# Altium footprint library ADP_SMT.PcbLib: 204 footprints (part 1 of 15)
Each footprint in its own frame and in the unit in brackets; x right, y up, seen from the top. Pads: shape width x height; smd on the part's side, far side on the other; paste and mask are expansions set on the pad; w line width, h text height; cw(c..) or ccw(c..) is an arc to the next point about the centre after c.
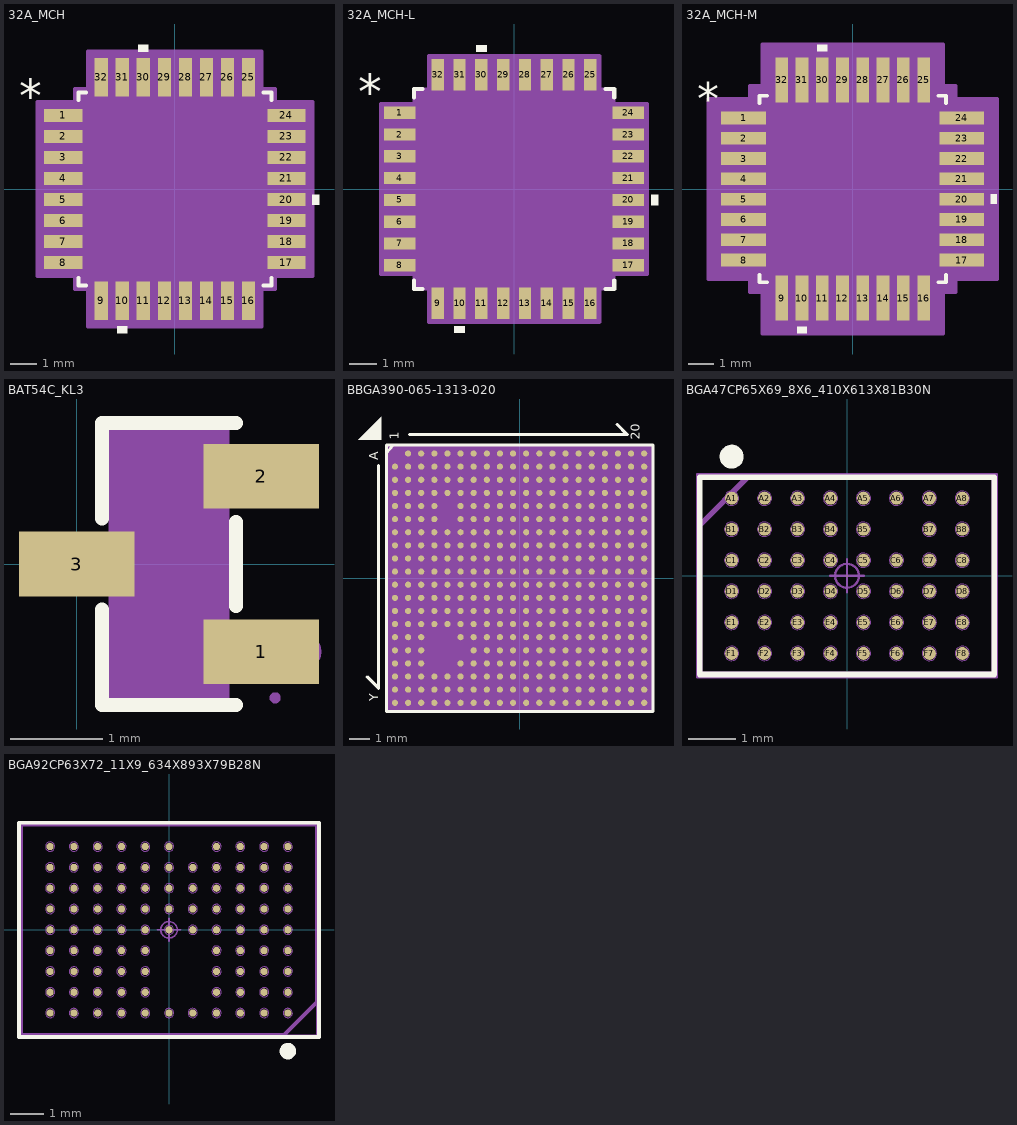
[diagram p0: the footprints below, top view; thin cyan lines are the x and y axes]

## 32A_MCH [mm]
pads (32):
  rect 1.461x0.501 smd paste+0 mask+0: 1(-4.25,2.8) 2(-4.25,2) 3(-4.25,1.2) 4(-4.25,0.4) 5(-4.25,-0.4) 6(-4.25,-1.2) 7(-4.25,-2) 8(-4.25,-2.8) 17(4.25,-2.8) 18(4.25,-2) 19(4.25,-1.2) 20(4.25,-0.4) 21(4.25,0.4) 22(4.25,1.2) 23(4.25,2) 24(4.25,2.8)
  rect 0.501x1.461 smd paste+0 mask+0: 9(-2.8,-4.25) 10(-2,-4.25) 11(-1.2,-4.25) 12(-0.4,-4.25) 13(0.4,-4.25) 14(1.2,-4.25) 15(2,-4.25) 16(2.8,-4.25) 25(2.8,4.25) 26(2,4.25) 27(1.2,4.25) 28(0.4,4.25) 29(-0.4,4.25) 30(-1.2,4.25) 31(-2,4.25) 32(-2.8,4.25)
Top Overlay:
  region: -1.01,5.235 -1.391,5.235 -1.391,5.489 -1.01,5.489
  region: 5.235,-0.209 5.489,-0.209 5.489,-0.59 5.235,-0.59
  region: -1.81,-5.235 -2.191,-5.235 -2.191,-5.489 -1.81,-5.489
  lines w0.152: -3.677,-3.383 -3.677,-3.677 -3.383,-3.677 ; -3.677,3.383 -3.677,3.677 -3.383,3.677 ; 3.383,-3.677 3.677,-3.677 3.677,-3.383 ; 3.383,3.677 3.677,3.677 3.677,3.383
  text "*" at -5.933,2.946 h1.27
Mechanical 13:
  lines w0.025: -3.55,2.28 -2.28,3.55 ; -4.625,-3.025 -3.55,-3.025 -3.55,-2.575 -4.625,-2.575 -4.625,-3.025 ; -4.625,-2.225 -3.55,-2.225 -3.55,-1.775 -4.625,-1.775 -4.625,-2.225 ; -4.625,-1.425 -3.55,-1.425 -3.55,-0.975 -4.625,-0.975 -4.625,-1.425 ; -4.625,-0.625 -3.55,-0.625 -3.55,-0.175 -4.625,-0.175 -4.625,-0.625 ; -4.625,0.175 -3.55,0.175 -3.55,0.625 -4.625,0.625 -4.625,0.175 ; -4.625,0.975 -3.55,0.975 -3.55,1.425 -4.625,1.425 -4.625,0.975 ; -4.625,1.775 -3.55,1.775 -3.55,2.225 -4.625,2.225 -4.625,1.775 ; -4.625,2.575 -3.55,2.575 -3.55,3.025 -4.625,3.025 -4.625,2.575 ; -3.55,-3.55 -3.55,3.55 3.55,3.55 3.55,-3.55 -3.55,-3.55 ; -3.025,-4.625 -2.575,-4.625 -2.575,-3.55 -3.025,-3.55 -3.025,-4.625 ; -3.025,3.55 -3.025,4.625 -2.575,4.625 -2.575,3.55 -3.025,3.55 ; -2.225,-4.625 -1.775,-4.625 -1.775,-3.55 -2.225,-3.55 -2.225,-4.625 ; -2.225,3.55 -2.225,4.625 -1.775,4.625 -1.775,3.55 -2.225,3.55 ; -1.425,-4.625 -0.975,-4.625 -0.975,-3.55 -1.425,-3.55 -1.425,-4.625 ; -1.425,3.55 -1.425,4.625 -0.975,4.625 -0.975,3.55 -1.425,3.55 ; -0.625,-4.625 -0.175,-4.625 -0.175,-3.55 -0.625,-3.55 -0.625,-4.625 ; -0.625,3.55 -0.625,4.625 -0.175,4.625 -0.175,3.55 -0.625,3.55 ; 0.175,-4.625 0.625,-4.625 0.625,-3.55 0.175,-3.55 0.175,-4.625 ; 0.175,3.55 0.175,4.625 0.625,4.625 0.625,3.55 0.175,3.55 ; 0.975,-4.625 1.425,-4.625 1.425,-3.55 0.975,-3.55 0.975,-4.625 ; 0.975,3.55 0.975,4.625 1.425,4.625 1.425,3.55 0.975,3.55 ; 1.775,-4.625 2.225,-4.625 2.225,-3.55 1.775,-3.55 1.775,-4.625 ; 1.775,3.55 1.775,4.625 2.225,4.625 2.225,3.55 1.775,3.55 ; 2.575,-4.625 3.025,-4.625 3.025,-3.55 2.575,-3.55 2.575,-4.625 ; 2.575,3.55 2.575,4.625 3.025,4.625 3.025,3.55 2.575,3.55 ; 3.55,-3.025 4.625,-3.025 4.625,-2.575 3.55,-2.575 3.55,-3.025 ; 3.55,-2.225 4.625,-2.225 4.625,-1.775 3.55,-1.775 3.55,-2.225 ; 3.55,-1.425 4.625,-1.425 4.625,-0.975 3.55,-0.975 3.55,-1.425 ; 3.55,-0.625 4.625,-0.625 4.625,-0.175 3.55,-0.175 3.55,-0.625 ; 3.55,0.175 4.625,0.175 4.625,0.625 3.55,0.625 3.55,0.175 ; 3.55,0.975 4.625,0.975 4.625,1.425 3.55,1.425 3.55,0.975 ; 3.55,1.775 4.625,1.775 4.625,2.225 3.55,2.225 3.55,1.775 ; 3.55,2.575 4.625,2.575 4.625,3.025 3.55,3.025 3.55,2.575
  text "*" at -3.487,2.565 h1.27
Mechanical 15:
  region: -3.304,-3.804 -3.804,-3.804 -3.804,-3.304 -5.235,-3.304 -5.235,3.304 -3.804,3.304 -3.804,3.804 -3.304,3.804 -3.304,5.235 3.304,5.235 3.304,3.804 3.804,3.804 3.804,3.304 5.235,3.304 5.235,-3.304 3.804,-3.304 3.804,-3.804 3.304,-3.804 3.304,-5.235 -3.304,-5.235
  lines w0.152: -5.235,-3.304 -5.235,3.304 -3.804,3.304 -3.804,3.804 -3.304,3.804 -3.304,5.235 3.304,5.235 3.304,3.804 3.804,3.804 3.804,3.304 5.235,3.304 5.235,-3.304 3.804,-3.304 3.804,-3.804 3.304,-3.804 3.304,-5.235 -3.304,-5.235 -3.304,-3.804 -3.804,-3.804 -3.804,-3.304 -5.235,-3.304
3D body "32A_MCH.step": height 1.2, standoff 0, extent -4.625,-4.625 4.625,4.625

## 32A_MCH-L [mm]
pads (32):
  rect 1.156x0.45 smd paste+0 mask+0: 1(-4.199,2.8) 2(-4.199,2) 3(-4.199,1.2) 4(-4.199,0.4) 5(-4.199,-0.4) 6(-4.199,-1.2) 7(-4.199,-2) 8(-4.199,-2.8) 17(4.199,-2.8) 18(4.199,-2) 19(4.199,-1.2) 20(4.199,-0.4) 21(4.199,0.4) 22(4.199,1.2) 23(4.199,2) 24(4.199,2.8)
  rect 0.45x1.156 smd paste+0 mask+0: 9(-2.8,-4.199) 10(-2,-4.199) 11(-1.2,-4.199) 12(-0.4,-4.199) 13(0.4,-4.199) 14(1.2,-4.199) 15(2,-4.199) 16(2.8,-4.199) 25(2.8,4.199) 26(2,4.199) 27(1.2,4.199) 28(0.4,4.199) 29(-0.4,4.199) 30(-1.2,4.199) 31(-2,4.199) 32(-2.8,4.199)
Top Overlay:
  region: -1.01,5.031 -1.391,5.031 -1.391,5.285 -1.01,5.285
  region: 5.031,-0.209 5.285,-0.209 5.285,-0.59 5.031,-0.59
  region: -1.81,-5.031 -2.191,-5.031 -2.191,-5.285 -1.81,-5.285
  lines w0.152: -3.677,-3.358 -3.677,-3.677 -3.358,-3.677 ; -3.677,3.358 -3.677,3.677 -3.358,3.677 ; 3.358,-3.677 3.677,-3.677 3.677,-3.358 ; 3.358,3.677 3.677,3.677 3.677,3.358
  text "*" at -5.73,2.946 h1.27
Mechanical 13:
  lines w0.025: -3.55,2.28 -2.28,3.55 ; -4.625,-3.025 -3.55,-3.025 -3.55,-2.575 -4.625,-2.575 -4.625,-3.025 ; -4.625,-2.225 -3.55,-2.225 -3.55,-1.775 -4.625,-1.775 -4.625,-2.225 ; -4.625,-1.425 -3.55,-1.425 -3.55,-0.975 -4.625,-0.975 -4.625,-1.425 ; -4.625,-0.625 -3.55,-0.625 -3.55,-0.175 -4.625,-0.175 -4.625,-0.625 ; -4.625,0.175 -3.55,0.175 -3.55,0.625 -4.625,0.625 -4.625,0.175 ; -4.625,0.975 -3.55,0.975 -3.55,1.425 -4.625,1.425 -4.625,0.975 ; -4.625,1.775 -3.55,1.775 -3.55,2.225 -4.625,2.225 -4.625,1.775 ; -4.625,2.575 -3.55,2.575 -3.55,3.025 -4.625,3.025 -4.625,2.575 ; -3.55,-3.55 3.55,-3.55 3.55,3.55 -3.55,3.55 -3.55,-3.55 ; -3.025,-4.625 -2.575,-4.625 -2.575,-3.55 -3.025,-3.55 -3.025,-4.625 ; -3.025,3.55 -3.025,4.625 -2.575,4.625 -2.575,3.55 -3.025,3.55 ; -2.225,-4.625 -1.775,-4.625 -1.775,-3.55 -2.225,-3.55 -2.225,-4.625 ; -2.225,3.55 -2.225,4.625 -1.775,4.625 -1.775,3.55 -2.225,3.55 ; -1.425,-4.625 -0.975,-4.625 -0.975,-3.55 -1.425,-3.55 -1.425,-4.625 ; -1.425,3.55 -1.425,4.625 -0.975,4.625 -0.975,3.55 -1.425,3.55 ; -0.625,-4.625 -0.175,-4.625 -0.175,-3.55 -0.625,-3.55 -0.625,-4.625 ; -0.625,3.55 -0.625,4.625 -0.175,4.625 -0.175,3.55 -0.625,3.55 ; 0.175,-4.625 0.625,-4.625 0.625,-3.55 0.175,-3.55 0.175,-4.625 ; 0.175,3.55 0.175,4.625 0.625,4.625 0.625,3.55 0.175,3.55 ; 0.975,-4.625 1.425,-4.625 1.425,-3.55 0.975,-3.55 0.975,-4.625 ; 0.975,3.55 0.975,4.625 1.425,4.625 1.425,3.55 0.975,3.55 ; 1.775,-4.625 2.225,-4.625 2.225,-3.55 1.775,-3.55 1.775,-4.625 ; 1.775,3.55 1.775,4.625 2.225,4.625 2.225,3.55 1.775,3.55 ; 2.575,-4.625 3.025,-4.625 3.025,-3.55 2.575,-3.55 2.575,-4.625 ; 2.575,3.55 2.575,4.625 3.025,4.625 3.025,3.55 2.575,3.55 ; 3.55,-3.025 4.625,-3.025 4.625,-2.575 3.55,-2.575 3.55,-3.025 ; 3.55,-2.225 4.625,-2.225 4.625,-1.775 3.55,-1.775 3.55,-2.225 ; 3.55,-1.425 4.625,-1.425 4.625,-0.975 3.55,-0.975 3.55,-1.425 ; 3.55,-0.625 4.625,-0.625 4.625,-0.175 3.55,-0.175 3.55,-0.625 ; 3.55,0.175 4.625,0.175 4.625,0.625 3.55,0.625 3.55,0.175 ; 3.55,0.975 4.625,0.975 4.625,1.425 3.55,1.425 3.55,0.975 ; 3.55,1.775 4.625,1.775 4.625,2.225 3.55,2.225 3.55,1.775 ; 3.55,2.575 4.625,2.575 4.625,3.025 3.55,3.025 3.55,2.575
  text "*" at -3.487,2.565 h1.27
Mechanical 15:
  region: -3.127,-3.652 -3.652,-3.652 -3.652,-3.127 -4.879,-3.127 -4.879,3.127 -3.652,3.127 -3.652,3.652 -3.127,3.652 -3.127,4.879 3.127,4.879 3.127,3.652 3.652,3.652 3.652,3.127 4.879,3.127 4.879,-3.127 3.652,-3.127 3.652,-3.652 3.127,-3.652 3.127,-4.879 -3.127,-4.879
  lines w0.152: -4.879,-3.127 -4.879,3.127 -3.652,3.127 -3.652,3.652 -3.127,3.652 -3.127,4.879 3.127,4.879 3.127,3.652 3.652,3.652 3.652,3.127 4.879,3.127 4.879,-3.127 3.652,-3.127 3.652,-3.652 3.127,-3.652 3.127,-4.879 -3.127,-4.879 -3.127,-3.652 -3.652,-3.652 -3.652,-3.127 -4.879,-3.127
3D body "32A_MCH.step": height 1.2, standoff 0, extent -4.625,-4.625 4.625,4.625

## 32A_MCH-M [mm]
pads (32):
  rect 1.766x0.501 smd paste+0 mask+0: 1(-4.301,2.8) 2(-4.301,2) 3(-4.301,1.2) 4(-4.301,0.4) 5(-4.301,-0.4) 6(-4.301,-1.2) 7(-4.301,-2) 8(-4.301,-2.8) 17(4.301,-2.8) 18(4.301,-2) 19(4.301,-1.2) 20(4.301,-0.4) 21(4.301,0.4) 22(4.301,1.2) 23(4.301,2) 24(4.301,2.8)
  rect 0.501x1.766 smd paste+0 mask+0: 9(-2.8,-4.301) 10(-2,-4.301) 11(-1.2,-4.301) 12(-0.4,-4.301) 13(0.4,-4.301) 14(1.2,-4.301) 15(2,-4.301) 16(2.8,-4.301) 25(2.8,4.301) 26(2,4.301) 27(1.2,4.301) 28(0.4,4.301) 29(-0.4,4.301) 30(-1.2,4.301) 31(-2,4.301) 32(-2.8,4.301)
Top Overlay:
  region: -1.01,5.438 -1.391,5.438 -1.391,5.692 -1.01,5.692
  region: 5.438,-0.209 5.692,-0.209 5.692,-0.59 5.438,-0.59
  region: -1.81,-5.438 -2.191,-5.438 -2.191,-5.692 -1.81,-5.692
  lines w0.152: -3.677,-3.383 -3.677,-3.677 -3.383,-3.677 ; -3.677,3.383 -3.677,3.677 -3.383,3.677 ; 3.383,-3.677 3.677,-3.677 3.677,-3.383 ; 3.383,3.677 3.677,3.677 3.677,3.383
  text "*" at -6.136,2.946 h1.27
Mechanical 13:
  lines w0.025: -3.55,2.28 -2.28,3.55 ; -4.625,-3.025 -3.55,-3.025 -3.55,-2.575 -4.625,-2.575 -4.625,-3.025 ; -4.625,-2.225 -3.55,-2.225 -3.55,-1.775 -4.625,-1.775 -4.625,-2.225 ; -4.625,-1.425 -3.55,-1.425 -3.55,-0.975 -4.625,-0.975 -4.625,-1.425 ; -4.625,-0.625 -3.55,-0.625 -3.55,-0.175 -4.625,-0.175 -4.625,-0.625 ; -4.625,0.175 -3.55,0.175 -3.55,0.625 -4.625,0.625 -4.625,0.175 ; -4.625,0.975 -3.55,0.975 -3.55,1.425 -4.625,1.425 -4.625,0.975 ; -4.625,1.775 -3.55,1.775 -3.55,2.225 -4.625,2.225 -4.625,1.775 ; -4.625,2.575 -3.55,2.575 -3.55,3.025 -4.625,3.025 -4.625,2.575 ; -3.55,-3.55 3.55,-3.55 3.55,3.55 -3.55,3.55 -3.55,-3.55 ; -3.025,-4.625 -2.575,-4.625 -2.575,-3.55 -3.025,-3.55 -3.025,-4.625 ; -3.025,3.55 -3.025,4.625 -2.575,4.625 -2.575,3.55 -3.025,3.55 ; -2.225,-4.625 -1.775,-4.625 -1.775,-3.55 -2.225,-3.55 -2.225,-4.625 ; -2.225,3.55 -2.225,4.625 -1.775,4.625 -1.775,3.55 -2.225,3.55 ; -1.425,-4.625 -0.975,-4.625 -0.975,-3.55 -1.425,-3.55 -1.425,-4.625 ; -1.425,3.55 -1.425,4.625 -0.975,4.625 -0.975,3.55 -1.425,3.55 ; -0.625,-4.625 -0.175,-4.625 -0.175,-3.55 -0.625,-3.55 -0.625,-4.625 ; -0.625,3.55 -0.625,4.625 -0.175,4.625 -0.175,3.55 -0.625,3.55 ; 0.175,-4.625 0.625,-4.625 0.625,-3.55 0.175,-3.55 0.175,-4.625 ; 0.175,3.55 0.175,4.625 0.625,4.625 0.625,3.55 0.175,3.55 ; 0.975,-4.625 1.425,-4.625 1.425,-3.55 0.975,-3.55 0.975,-4.625 ; 0.975,3.55 0.975,4.625 1.425,4.625 1.425,3.55 0.975,3.55 ; 1.775,-4.625 2.225,-4.625 2.225,-3.55 1.775,-3.55 1.775,-4.625 ; 1.775,3.55 1.775,4.625 2.225,4.625 2.225,3.55 1.775,3.55 ; 2.575,-4.625 3.025,-4.625 3.025,-3.55 2.575,-3.55 2.575,-4.625 ; 2.575,3.55 2.575,4.625 3.025,4.625 3.025,3.55 2.575,3.55 ; 3.55,-3.025 4.625,-3.025 4.625,-2.575 3.55,-2.575 3.55,-3.025 ; 3.55,-2.225 4.625,-2.225 4.625,-1.775 3.55,-1.775 3.55,-2.225 ; 3.55,-1.425 4.625,-1.425 4.625,-0.975 3.55,-0.975 3.55,-1.425 ; 3.55,-0.625 4.625,-0.625 4.625,-0.175 3.55,-0.175 3.55,-0.625 ; 3.55,0.175 4.625,0.175 4.625,0.625 3.55,0.625 3.55,0.175 ; 3.55,0.975 4.625,0.975 4.625,1.425 3.55,1.425 3.55,0.975 ; 3.55,1.775 4.625,1.775 4.625,2.225 3.55,2.225 3.55,1.775 ; 3.55,2.575 4.625,2.575 4.625,3.025 3.55,3.025 3.55,2.575
  text "*" at -3.487,2.565 h1.27
Mechanical 15:
  region: -3.558,-4.058 -4.058,-4.058 -4.058,-3.558 -5.692,-3.558 -5.692,3.558 -4.058,3.558 -4.058,4.058 -3.558,4.058 -3.558,5.692 3.558,5.692 3.558,4.058 4.058,4.058 4.058,3.558 5.692,3.558 5.692,-3.558 4.058,-3.558 4.058,-4.058 3.558,-4.058 3.558,-5.692 -3.558,-5.692
  lines w0.152: -5.692,-3.558 -5.692,3.558 -4.058,3.558 -4.058,4.058 -3.558,4.058 -3.558,5.692 3.558,5.692 3.558,4.058 4.058,4.058 4.058,3.558 5.692,3.558 5.692,-3.558 4.058,-3.558 4.058,-4.058 3.558,-4.058 3.558,-5.692 -3.558,-5.692 -3.558,-4.058 -4.058,-4.058 -4.058,-3.558 -5.692,-3.558
3D body "32A_MCH.step": height 1.2, standoff 0, extent -4.625,-4.625 4.625,4.625

## BAT54C_KL3 [mm]
pads (3):
  rect 1.25x0.7 smd: 1(2,-0.95) 2(2,0.95) 3(0,0)
Top Overlay:
  lines w0.152: 0.274,-0.495 0.274,-1.526 1.726,-1.526 ; 0.274,0.495 0.274,1.526 1.726,1.526 ; 1.726,-0.455 1.726,0.455
Mechanical 4:
  region: 0.35,-1.45 0.35,1.45 1.65,1.45 1.65,-1.45
Mechanical 5:
  region: 1.85,-1.165 1.85,-0.735 2.15,-0.735 2.15,-1.165
  pour cut-out: 1.64,-1.165 1.64,-0.735 1.86,-0.735 1.86,-1.165
  region: 1.85,0.735 1.85,1.165 2.15,1.165 2.15,0.735
  pour cut-out: 1.64,0.735 1.64,1.165 1.86,1.165 1.86,0.735
  region: 0.15,-0.215 0.15,0.215 -0.15,0.215 -0.15,-0.215
  pour cut-out: 0.14,-0.215 0.14,0.215 0.36,0.215 0.36,-0.215
Mechanical 6:
  circle w0.06: c2.15,-1.45 r0.03
Mechanical 15:
  circle w0.2: c2.45,-0.95 r0.1

## BBGA390-065-1313-020 [mil] "K230"
pads (390):
  round 12 smd: A2(-217.52,243.11) A3(-191.93,243.11) A4(-166.34,243.11) A5(-140.75,243.11) A6(-115.16,243.11) A7(-89.57,243.11) A8(-63.98,243.11) A9(-38.39,243.11) A10(-12.8,243.11) A11(12.79,243.11) A12(38.38,243.11) A13(63.97,243.11) A14(89.56,243.11) A15(115.15,243.11) A16(140.74,243.11) A17(166.33,243.11) A18(191.92,243.11) A19(217.51,243.11) A20(243.1,243.11) B1(-243.11,217.52) B2(-217.52,217.52) B3(-191.93,217.52) B4(-166.34,217.52) B5(-140.75,217.52) B6(-115.16,217.52) B7(-89.57,217.52) B8(-63.98,217.52) B9(-38.39,217.52) B10(-12.8,217.52) B11(12.79,217.52) B12(38.38,217.52) B13(63.97,217.52) B14(89.56,217.52) B15(115.15,217.52) B16(140.74,217.52) B17(166.33,217.52) B18(191.92,217.52) B19(217.51,217.52) B20(243.1,217.52) C1(-243.11,191.93) C2(-217.52,191.93) C3(-191.93,191.93) C4(-166.34,191.93) C5(-140.75,191.93) C6(-115.16,191.93) C7(-89.57,191.93) C8(-63.98,191.93) C9(-38.39,191.93) C10(-12.8,191.93) C11(12.79,191.93) C12(38.38,191.93) C13(63.97,191.93) C14(89.56,191.93) C15(115.15,191.93) C16(140.74,191.93) C17(166.33,191.93) C18(191.92,191.93) C19(217.51,191.93) C20(243.1,191.93) D1(-243.11,166.34) D2(-217.52,166.34) D3(-191.93,166.34) D4(-166.34,166.34) D5(-140.75,166.34) D6(-115.16,166.34) D7(-89.57,166.34) D8(-63.98,166.34) D9(-38.39,166.34) D10(-12.8,166.34) D11(12.79,166.34) D12(38.38,166.34) D13(63.97,166.34) D14(89.56,166.34) D15(115.15,166.34) D16(140.74,166.34) D17(166.33,166.34) D18(191.92,166.34) D19(217.51,166.34) D20(243.1,166.34) E1(-243.11,140.75) E2(-217.52,140.75) E3(-191.93,140.75) E4(-166.34,140.75) E6(-115.16,140.75) E7(-89.57,140.75) E8(-63.98,140.75) E9(-38.39,140.75) E10(-12.8,140.75) E11(12.79,140.75) E12(38.38,140.75) E13(63.97,140.75) E14(89.56,140.75) E15(115.15,140.75) E16(140.74,140.75) E17(166.33,140.75) E18(191.92,140.75) E19(217.51,140.75) E20(243.1,140.75) F1(-243.11,115.16) F2(-217.52,115.16) F3(-191.93,115.16) F4(-166.34,115.16) F6(-115.16,115.16) F7(-89.57,115.16) F8(-63.98,115.16) F9(-38.39,115.16) F10(-12.8,115.16) F11(12.79,115.16) F12(38.38,115.16) F13(63.97,115.16) F14(89.56,115.16) F15(115.15,115.16) F16(140.74,115.16) F17(166.33,115.16) F18(191.92,115.16) F19(217.51,115.16) F20(243.1,115.16) G1(-243.11,89.57) G2(-217.52,89.57) G3(-191.93,89.57) G4(-166.34,89.57) G5(-140.75,89.57) G6(-115.16,89.57) G7(-89.57,89.57) G8(-63.98,89.57) G9(-38.39,89.57) G10(-12.8,89.57) G11(12.79,89.57) G12(38.38,89.57) G13(63.97,89.57) G14(89.56,89.57) G15(115.15,89.57) G16(140.74,89.57) G17(166.33,89.57) G18(191.92,89.57) G19(217.51,89.57) G20(243.1,89.57) H1(-243.11,63.98) H2(-217.52,63.98) H3(-191.93,63.98) H4(-166.34,63.98) H5(-140.75,63.98) H6(-115.16,63.98) H7(-89.57,63.98) H8(-63.98,63.98) H9(-38.39,63.98) H10(-12.8,63.98) H11(12.79,63.98) H12(38.38,63.98) H13(63.97,63.98) H14(89.56,63.98) H15(115.15,63.98) H16(140.74,63.98) H17(166.33,63.98) H18(191.92,63.98) H19(217.51,63.98) H20(243.1,63.98) J1(-243.11,38.39) J2(-217.52,38.39) J3(-191.93,38.39) J4(-166.34,38.39) J5(-140.75,38.39) J6(-115.16,38.39) J7(-89.57,38.39) J8(-63.98,38.39) J9(-38.39,38.39) J10(-12.8,38.39) J11(12.79,38.39) J12(38.38,38.39) J13(63.97,38.39) J14(89.56,38.39) J15(115.15,38.39) J16(140.74,38.39) J17(166.33,38.39) J18(191.92,38.39) J19(217.51,38.39) J20(243.1,38.39) K1(-243.11,12.8) K2(-217.52,12.8) K3(-191.93,12.8) K4(-166.34,12.8) K5(-140.75,12.8) K6(-115.16,12.8) K7(-89.57,12.8) K8(-63.98,12.8) K9(-38.39,12.8) K10(-12.8,12.8) K11(12.79,12.8) K12(38.38,12.8) K13(63.97,12.8) K14(89.56,12.8) K15(115.15,12.8) K16(140.74,12.8) K17(166.33,12.8) K18(191.92,12.8) K19(217.51,12.8) K20(243.1,12.8) L1(-243.11,-12.79) L2(-217.52,-12.79) L3(-191.93,-12.79) L4(-166.34,-12.79) L5(-140.75,-12.79) L6(-115.16,-12.79) L7(-89.57,-12.79) L8(-63.98,-12.79) L9(-38.39,-12.79) L10(-12.8,-12.79) L11(12.79,-12.79) L12(38.38,-12.79) L13(63.97,-12.79) L14(89.56,-12.79) L15(115.15,-12.79) L16(140.74,-12.79) L17(166.33,-12.79) L18(191.92,-12.79) L19(217.51,-12.79) L20(243.1,-12.79) M1(-243.11,-38.38) M2(-217.52,-38.38) M3(-191.93,-38.38) M4(-166.34,-38.38) M5(-140.75,-38.38) M6(-115.16,-38.38) M7(-89.57,-38.38) M8(-63.98,-38.38) M9(-38.39,-38.38) M10(-12.8,-38.38) M11(12.79,-38.38) M12(38.38,-38.38) M13(63.97,-38.38) M14(89.56,-38.38) M15(115.15,-38.38) M16(140.74,-38.38) M17(166.33,-38.38) M18(191.92,-38.38) M19(217.51,-38.38) M20(243.1,-38.38) N1(-243.11,-63.97) N2(-217.52,-63.97) N3(-191.93,-63.97) N4(-166.34,-63.97) N5(-140.75,-63.97) N6(-115.16,-63.97) N7(-89.57,-63.97) N8(-63.98,-63.97) N9(-38.39,-63.97) N10(-12.8,-63.97) N11(12.79,-63.97) N12(38.38,-63.97) N13(63.97,-63.97) N14(89.56,-63.97) N15(115.15,-63.97) N16(140.74,-63.97) N17(166.33,-63.97) N18(191.92,-63.97) N19(217.51,-63.97) N20(243.1,-63.97) P1(-243.11,-89.56) P2(-217.52,-89.56) P3(-191.93,-89.56) P4(-166.34,-89.56) P5(-140.75,-89.56) P6(-115.16,-89.56) P7(-89.57,-89.56) P8(-63.98,-89.56) P9(-38.39,-89.56) P10(-12.8,-89.56) P11(12.79,-89.56) P12(38.38,-89.56) P13(63.97,-89.56) P14(89.56,-89.56) P15(115.15,-89.56) P16(140.74,-89.56) P17(166.33,-89.56) P18(191.92,-89.56) P19(217.51,-89.56) P20(243.1,-89.56) R1(-243.11,-115.15) R2(-217.52,-115.15) R3(-191.93,-115.15) R6(-115.16,-115.15) R7(-89.57,-115.15) R8(-63.98,-115.15) R9(-38.39,-115.15) R10(-12.8,-115.15) R11(12.79,-115.15) R12(38.38,-115.15) R13(63.97,-115.15) R14(89.56,-115.15) R15(115.15,-115.15) R16(140.74,-115.15) R17(166.33,-115.15) R18(191.92,-115.15) R19(217.51,-115.15) R20(243.1,-115.15) T1(-243.11,-140.74) T2(-217.52,-140.74) T3(-191.93,-140.74) T7(-89.57,-140.74) T8(-63.98,-140.74) T9(-38.39,-140.74) T10(-12.8,-140.74) T11(12.79,-140.74) T12(38.38,-140.74) T13(63.97,-140.74) T14(89.56,-140.74) T15(115.15,-140.74) T16(140.74,-140.74) T17(166.33,-140.74) T18(191.92,-140.74) T19(217.51,-140.74) T20(243.1,-140.74) U1(-243.11,-166.33) U2(-217.52,-166.33) U3(-191.93,-166.33) U6(-115.16,-166.33) U7(-89.57,-166.33) U8(-63.98,-166.33) U9(-38.39,-166.33) U10(-12.8,-166.33) U11(12.79,-166.33) U12(38.38,-166.33) U13(63.97,-166.33) U14(89.56,-166.33) U15(115.15,-166.33) U16(140.74,-166.33) U17(166.33,-166.33) U18(191.92,-166.33) U19(217.51,-166.33) U20(243.1,-166.33) V1(-243.11,-191.92) V2(-217.52,-191.92) V3(-191.93,-191.92) V4(-166.34,-191.92) V5(-140.75,-191.92) V6(-115.16,-191.92) V7(-89.57,-191.92) V8(-63.98,-191.92) V9(-38.39,-191.92) V10(-12.8,-191.92) V11(12.79,-191.92) V12(38.38,-191.92) V13(63.97,-191.92) V14(89.56,-191.92) V15(115.15,-191.92) V16(140.74,-191.92) V17(166.33,-191.92) V18(191.92,-191.92) V19(217.51,-191.92) V20(243.1,-191.92) W1(-243.11,-217.51) W2(-217.52,-217.51) W3(-191.93,-217.51) W4(-166.34,-217.51) W5(-140.75,-217.51) W6(-115.16,-217.51) W7(-89.57,-217.51) W8(-63.98,-217.51) W9(-38.39,-217.51) W10(-12.8,-217.51) W11(12.79,-217.51) W12(38.38,-217.51) W13(63.97,-217.51) W14(89.56,-217.51) W15(115.15,-217.51) W16(140.74,-217.51) W17(166.33,-217.51) W18(191.92,-217.51) W19(217.51,-217.51) W20(243.1,-217.51) Y1(-243.11,-243.1) Y2(-217.52,-243.1) Y3(-191.93,-243.1) Y4(-166.34,-243.1) Y5(-140.75,-243.1) Y6(-115.16,-243.1) Y7(-89.57,-243.1) Y8(-63.98,-243.1) Y9(-38.39,-243.1) Y10(-12.8,-243.1) Y11(12.79,-243.1) Y12(38.38,-243.1) Y13(63.97,-243.1) Y14(89.56,-243.1) Y15(115.15,-243.1) Y16(140.74,-243.1) Y17(166.33,-243.1) Y18(191.92,-243.1) Y19(217.51,-243.1) Y20(243.1,-243.1)
Top Overlay:
  dashed: -315.28,270 -270,270 -270,315.27
  lines w6: -297.5,-192.5 -275,-215 -275,220 ; -260,244 -246,260 ; -215,280 210,280 190,300 ; -260,-260 260,-260 260,260 -260,260 -260,-260
  text "A" at -270,230 h30
  text "Y" at -270,-240 h30
  text "1" at -230,270 h30
  text "20" at 240,270 h30
Mechanical 6:
  text "BGA390-065-1313-020" at -255,300 h30
  text "K230-USIP" at -205,270 h20
Top 3D Body:
  region: -260,-260 -260,260 260,260 260,-260
Top Assembly:
  text "K17" at 172.83,11.78 h0.01
  text "U7" at -83.07,-167.35 h0.01
  text "J16" at 147.24,37.37 h0.01
  text "T19" at 224.01,-141.76 h0.01
  text "P18" at 198.42,-90.58 h0.01
  text "G7" at -83.07,88.55 h0.01
  text "G8" at -57.48,88.55 h0.01
  text "D1" at -236.61,165.32 h0.01
  text "C1" at -236.61,190.91 h0.01
  text "G3" at -185.43,88.55 h0.01
  text "B1" at -236.61,216.5 h0.01
  text "D2" at -211.02,165.32 h0.01
  text "C2" at -211.02,190.91 h0.01
  text "K7" at -83.07,11.78 h0.01
  text "E2" at -211.02,139.73 h0.01
  text "E1" at -236.61,139.73 h0.01
  text "F9" at -31.89,114.14 h0.01
  text "F2" at -211.02,114.14 h0.01
  text "F1" at -236.61,114.14 h0.01
  text "F3" at -185.43,114.14 h0.01
  text "E3" at -185.43,139.73 h0.01
  text "G2" at -211.02,88.55 h0.01
  text "G1" at -236.61,88.55 h0.01
  text "U15" at 121.65,-167.35 h0.01
  text "T14" at 96.06,-141.76 h0.01
  text "K15" at 121.65,11.78 h0.01
  text "R8" at -57.48,-116.17 h0.01
  text "N6" at -108.66,-64.99 h0.01
  text "N7" at -83.07,-64.99 h0.01
  text "R9" at -31.89,-116.17 h0.01
  text "T12" at 44.88,-141.76 h0.01
  text "V13" at 70.47,-192.94 h0.01
  text "Y14" at 96.06,-244.12 h0.01
  text "U13" at 70.47,-167.35 h0.01
  text "T13" at 70.47,-141.76 h0.01
  text "U12" at 44.88,-167.35 h0.01
  text "W14" at 96.06,-218.53 h0.01
  text "C4" at -159.84,190.91 h0.01
  text "D4" at -159.84,165.32 h0.01
  text "M1" at -236.61,-39.4 h0.01
  text "W13" at 70.47,-218.53 h0.01
  text "W12" at 44.88,-218.53 h0.01
  text "U11" at 19.29,-167.35 h0.01
  text "T10" at -6.3,-141.76 h0.01
  text "T11" at 19.29,-141.76 h0.01
  text "V11" at 19.29,-192.94 h0.01
  text "U9" at -31.89,-167.35 h0.01
  text "V10" at -6.3,-192.94 h0.01
  text "V12" at 44.88,-192.94 h0.01
  text "V9" at -31.89,-192.94 h0.01
  text "Y12" at 44.88,-244.12 h0.01
  text "U10" at -6.3,-167.35 h0.01
  text "U6" at -108.66,-167.35 h0.01
  text "K19" at 224.01,11.78 h0.01
  text "M3" at -185.43,-39.4 h0.01
  text "M5" at -134.25,-39.4 h0.01
  text "N1" at -236.61,-64.99 h0.01
  text "N4" at -159.84,-64.99 h0.01
  text "P4" at -159.84,-90.58 h0.01
  text "P3" at -185.43,-90.58 h0.01
  text "N2" at -211.02,-64.99 h0.01
  text "P1" at -236.61,-90.58 h0.01
  text "M4" at -159.84,-39.4 h0.01
  text "P2" at -211.02,-90.58 h0.01
  text "M2" at -211.02,-39.4 h0.01
  text "P5" at -134.25,-90.58 h0.01
  text "H5" at -134.25,62.96 h0.01
  text "F8" at -57.48,114.14 h0.01
  text "F7" at -83.07,114.14 h0.01
  text "J3" at -185.43,37.37 h0.01
  text "G4" at -159.84,88.55 h0.01
  text "H1" at -236.61,62.96 h0.01
  text "J1" at -236.61,37.37 h0.01
  text "H3" at -185.43,62.96 h0.01
  text "F11" at 19.29,114.14 h0.01
  text "J4" at -159.84,37.37 h0.01
  text "H4" at -159.84,62.96 h0.01
  text "J2" at -211.02,37.37 h0.01
  text "J6" at -108.66,37.37 h0.01
  text "H2" at -211.02,62.96 h0.01
  text "G5" at -134.25,88.55 h0.01
  text "G11" at 19.29,88.55 h0.01
  text "H12" at 44.88,62.96 h0.01
  text "J12" at 44.88,37.37 h0.01
  text "G12" at 44.88,88.55 h0.01
  text "E9" at -31.89,139.73 h0.01
  text "Y11" at 19.29,-244.12 h0.01
  text "Y10" at -6.3,-244.12 h0.01
  text "W10" at -6.3,-218.53 h0.01
  text "W9" at -31.89,-218.53 h0.01
  text "Y9" at -31.89,-244.12 h0.01
  text "A9" at -31.89,242.09 h0.01
  text "A8" at -57.48,242.09 h0.01
  text "B8" at -57.48,216.5 h0.01
  text "U2" at -211.02,-167.35 h0.01
  text "D8" at -57.48,165.32 h0.01
  text "U1" at -236.61,-167.35 h0.01
  text "A12" at 44.88,242.09 h0.01
  text "T2" at -211.02,-141.76 h0.01
  text "B12" at 44.88,216.5 h0.01
  text "T1" at -236.61,-141.76 h0.01
  text "D12" at 44.88,165.32 h0.01
  text "R2" at -211.02,-116.17 h0.01
  text "C12" at 44.88,190.91 h0.01
  text "R1" at -236.61,-116.17 h0.01
  text "A11" at 19.29,242.09 h0.01
  text "A10" at -6.3,242.09 h0.01
  text "B10" at -6.3,216.5 h0.01
  text "W5" at -134.25,-218.53 h0.01
  text "C10" at -6.3,190.91 h0.01
  text "Y5" at -134.25,-244.12 h0.01
  text "B9" at -31.89,216.5 h0.01
  text "C11" at 19.29,190.91 h0.01
  text "Y6" at -108.66,-244.12 h0.01
  text "B11" at 19.29,216.5 h0.01
  text "W6" at -108.66,-218.53 h0.01
  text "Y4" at -159.84,-244.12 h0.01
  text "W4" at -159.84,-218.53 h0.01
  text "V1" at -236.61,-192.94 h0.01
  text "V2" at -211.02,-192.94 h0.01
  text "Y3" at -185.43,-244.12 h0.01
  text "W3" at -185.43,-218.53 h0.01
  text "Y2" at -211.02,-244.12 h0.01
  text "N13" at 70.47,-64.99 h0.01
  text "L13" at 70.47,-13.81 h0.01
  text "M13" at 70.47,-39.4 h0.01
  text "K13" at 70.47,11.78 h0.01
  text "W2" at -211.02,-218.53 h0.01
  text "L6" at -108.66,-13.81 h0.01
  text "L5" at -134.25,-13.81 h0.01
  text "L4" at -159.84,-13.81 h0.01
  text "L3" at -185.43,-13.81 h0.01
  text "L2" at -211.02,-13.81 h0.01
  text "L1" at -236.61,-13.81 h0.01
  text "K5" at -134.25,11.78 h0.01
  text "K4" at -159.84,11.78 h0.01
  text "K2" at -211.02,11.78 h0.01
  text "K1" at -236.61,11.78 h0.01
  text "J5" at -134.25,37.37 h0.01
  text "V14" at 96.06,-192.94 h0.01
  text "U14" at 96.06,-167.35 h0.01
  text "Y15" at 121.65,-244.12 h0.01
  text "V15" at 121.65,-192.94 h0.01
  text "W15" at 121.65,-218.53 h0.01
  text "C9" at -31.89,190.91 h0.01
  text "C8" at -57.48,190.91 h0.01
  text "L14" at 96.06,-13.81 h0.01
  text "M14" at 96.06,-39.4 h0.01
  text "H14" at 96.06,62.96 h0.01
  text "J14" at 96.06,37.37 h0.01
  text "N14" at 96.06,-64.99 h0.01
  text "B4" at -159.84,216.5 h0.01
  text "A4" at -159.84,242.09 h0.01
  text "B2" at -211.02,216.5 h0.01
  text "A2" at -211.02,242.09 h0.01
  text "D3" at -185.43,165.32 h0.01
  text "B3" at -185.43,216.5 h0.01
  text "A3" at -185.43,242.09 h0.01
  text "C3" at -185.43,190.91 h0.01
  text "F14" at 96.06,114.14 h0.01
  text "F15" at 121.65,114.14 h0.01
  text "E10" at -6.3,139.73 h0.01
  text "M7" at -83.07,-39.4 h0.01
  text "L18" at 198.42,-13.81 h0.01
  text "B6" at -108.66,216.5 h0.01
  text "J10" at -6.3,37.37 h0.01
  text "J9" at -31.89,37.37 h0.01
  text "J8" at -57.48,37.37 h0.01
  text "H10" at -6.3,62.96 h0.01
  text "H8" at -57.48,62.96 h0.01
  text "H9" at -31.89,62.96 h0.01
  text "F12" at 44.88,114.14 h0.01
  text "G10" at -6.3,88.55 h0.01
  text "G9" at -31.89,88.55 h0.01
  text "P13" at 70.47,-90.58 h0.01
  text "P9" at -31.89,-90.58 h0.01
  text "N9" at -31.89,-64.99 h0.01
  text "N11" at 19.29,-64.99 h0.01
  text "M9" at -31.89,-39.4 h0.01
  text "M11" at 19.29,-39.4 h0.01
  text "L9" at -31.89,-13.81 h0.01
  text "K9" at -31.89,11.78 h0.01
  text "K11" at 19.29,11.78 h0.01
  text "P11" at 19.29,-90.58 h0.01
  text "L11" at 19.29,-13.81 h0.01
  text "W7" at -83.07,-218.53 h0.01
  text "Y7" at -83.07,-244.12 h0.01
  text "Y8" at -57.48,-244.12 h0.01
  text "W8" at -57.48,-218.53 h0.01
  text "W11" at 19.29,-218.53 h0.01
  text "A6" at -108.66,242.09 h0.01
  text "C7" at -83.07,190.91 h0.01
  text "B7" at -83.07,216.5 h0.01
  text "A7" at -83.07,242.09 h0.01
  text "D7" at -83.07,165.32 h0.01
  text "C6" at -108.66,190.91 h0.01
  text "B5" at -134.25,216.5 h0.01
  text "C5" at -134.25,190.91 h0.01
  text "D5" at -134.25,165.32 h0.01
  text "V17" at 172.83,-192.94 h0.01
  text "C15" at 121.65,190.91 h0.01
  text "P17" at 172.83,-90.58 h0.01
  text "D18" at 198.42,165.32 h0.01
  text "V19" at 224.01,-192.94 h0.01
  text "B18" at 198.42,216.5 h0.01
  text "V20" at 249.6,-192.94 h0.01
  text "B15" at 121.65,216.5 h0.01
  text "W17" at 172.83,-218.53 h0.01
  text "Y17" at 172.83,-244.12 h0.01
  text "A15" at 121.65,242.09 h0.01
  text "A18" at 198.42,242.09 h0.01
  text "N17" at 172.83,-64.99 h0.01
  text "T20" at 249.6,-141.76 h0.01
  text "R19" at 224.01,-116.17 h0.01
  text "R20" at 249.6,-116.17 h0.01
  text "P19" at 224.01,-90.58 h0.01
  text "M18" at 198.42,-39.4 h0.01
  text "N20" at 249.6,-64.99 h0.01
  text "N19" at 224.01,-64.99 h0.01
  text "L16" at 147.24,-13.81 h0.01
  text "M19" at 224.01,-39.4 h0.01
  text "L17" at 172.83,-13.81 h0.01
  text "M20" at 249.6,-39.4 h0.01
  text "L20" at 249.6,-13.81 h0.01
  text "K20" at 249.6,11.78 h0.01
  text "U16" at 147.24,-167.35 h0.01
  text "T16" at 147.24,-141.76 h0.01
  text "U17" at 172.83,-167.35 h0.01
  text "Y18" at 198.42,-244.12 h0.01
  text "Y16" at 147.24,-244.12 h0.01
  text "V16" at 147.24,-192.94 h0.01
  text "V18" at 198.42,-192.94 h0.01
  text "W18" at 198.42,-218.53 h0.01
  text "B16" at 147.24,216.5 h0.01
  text "B17" at 172.83,216.5 h0.01
  text "A14" at 96.06,242.09 h0.01
  text "D14" at 96.06,165.32 h0.01
  text "A17" at 172.83,242.09 h0.01
  text "C16" at 147.24,190.91 h0.01
  text "B14" at 96.06,216.5 h0.01
  text "C14" at 96.06,190.91 h0.01
  text "T17" at 172.83,-141.76 h0.01
  text "U18" at 198.42,-167.35 h0.01
  text "U20" at 249.6,-167.35 h0.01
  text "T18" at 198.42,-141.76 h0.01
  text "W19" at 224.01,-218.53 h0.01
  text "R17" at 172.83,-116.17 h0.01
  text "P16" at 147.24,-90.58 h0.01
  text "R18" at 198.42,-116.17 h0.01
  text "C19" at 224.01,190.91 h0.01
  text "B19" at 224.01,216.5 h0.01
  text "E17" at 172.83,139.73 h0.01
  text "E18" at 198.42,139.73 h0.01
  text "C18" at 198.42,190.91 h0.01
  text "D17" at 172.83,165.32 h0.01
  text "D16" at 147.24,165.32 h0.01
  text "C17" at 172.83,190.91 h0.01
  text "D6" at -108.66,165.32 h0.01
  text "A5" at -134.25,242.09 h0.01
  text "R11" at 19.29,-116.17 h0.01
  text "H6" at -108.66,62.96 h0.01
  text "R15" at 121.65,-116.17 h0.01
  text "R13" at 70.47,-116.17 h0.01
  text "E11" at 19.29,139.73 h0.01
  text "F13" at 70.47,114.14 h0.01
  text "E12" at 44.88,139.73 h0.01
  text "G15" at 121.65,88.55 h0.01
  text "G16" at 147.24,88.55 h0.01
  text "G14" at 96.06,88.55 h0.01
  text "G13" at 70.47,88.55 h0.01
  text "T3" at -185.43,-141.76 h0.01
  text "T9" at -31.89,-141.76 h0.01
  text "T8" at -57.48,-141.76 h0.01
  text "T7" at -83.07,-141.76 h0.01
  text "P15" at 121.65,-90.58 h0.01
  text "P14" at 96.06,-90.58 h0.01
  text "R12" at 44.88,-116.17 h0.01
  text "R10" at -6.3,-116.17 h0.01
  text "P20" at 249.6,-90.58 h0.01
  text "R7" at -83.07,-116.17 h0.01
  text "R6" at -108.66,-116.17 h0.01
  text "R16" at 147.24,-116.17 h0.01
  text "R3" at -185.43,-116.17 h0.01
  text "R14" at 96.06,-116.17 h0.01
  text "P10" at -6.3,-90.58 h0.01
  text "P12" at 44.88,-90.58 h0.01
  text "P8" at -57.48,-90.58 h0.01
  text "P7" at -83.07,-90.58 h0.01
  text "P6" at -108.66,-90.58 h0.01
  text "N15" at 121.65,-64.99 h0.01
  text "N8" at -57.48,-64.99 h0.01
  text "N3" at -185.43,-64.99 h0.01
  text "N12" at 44.88,-64.99 h0.01
  text "N5" at -134.25,-64.99 h0.01
  text "M16" at 147.24,-39.4 h0.01
  text "M15" at 121.65,-39.4 h0.01
  text "M10" at -6.3,-39.4 h0.01
  text "M8" at -57.48,-39.4 h0.01
  text "M12" at 44.88,-39.4 h0.01
  text "M6" at -108.66,-39.4 h0.01
  text "L12" at 44.88,-13.81 h0.01
  text "L15" at 121.65,-13.81 h0.01
  text "L10" at -6.3,-13.81 h0.01
  text "L19" at 224.01,-13.81 h0.01
  text "L8" at -57.48,-13.81 h0.01
  text "L7" at -83.07,-13.81 h0.01
  text "K10" at -6.3,11.78 h0.01
  text "K8" at -57.48,11.78 h0.01
  text "K12" at 44.88,11.78 h0.01
  text "K6" at -108.66,11.78 h0.01
  text "K14" at 96.06,11.78 h0.01
  text "K16" at 147.24,11.78 h0.01
  text "K3" at -185.43,11.78 h0.01
  text "J7" at -83.07,37.37 h0.01
  text "J15" at 121.65,37.37 h0.01
  text "J11" at 19.29,37.37 h0.01
  text "J13" at 70.47,37.37 h0.01
  text "K18" at 198.42,11.78 h0.01
  text "D15" at 121.65,165.32 h0.01
  text "D10" at -6.3,165.32 h0.01
  text "D13" at 70.47,165.32 h0.01
  text "D11" at 19.29,165.32 h0.01
  text "D9" at -31.89,165.32 h0.01
  text "B20" at 249.6,216.5 h0.01
  text "B13" at 70.47,216.5 h0.01
  text "A19" at 224.01,242.09 h0.01
  text "A13" at 70.47,242.09 h0.01
  text "A16" at 147.24,242.09 h0.01
  text "G6" at -108.66,88.55 h0.01
  text "H7" at -83.07,62.96 h0.01
  text "H16" at 147.24,62.96 h0.01
  text "H15" at 121.65,62.96 h0.01
  text "H13" at 70.47,62.96 h0.01
  text "H20" at 249.6,62.96 h0.01
  text "H11" at 19.29,62.96 h0.01
  text "E16" at 147.24,139.73 h0.01
  text "E15" at 121.65,139.73 h0.01
  text "E14" at 96.06,139.73 h0.01
  text "E13" at 70.47,139.73 h0.01
  text "E19" at 224.01,139.73 h0.01
  text "F10" at -6.3,114.14 h0.01
  text "E4" at -159.84,139.73 h0.01
  text "E8" at -57.48,139.73 h0.01
  text "E7" at -83.07,139.73 h0.01
  text "E6" at -108.66,139.73 h0.01
  text "W20" at 249.6,-218.53 h0.01
  text "Y19" at 224.01,-244.12 h0.01
  text "Y13" at 70.47,-244.12 h0.01
  text "W16" at 147.24,-218.53 h0.01
  text "W1" at -236.61,-218.53 h0.01
  text "V8" at -57.48,-192.94 h0.01
  text "V7" at -83.07,-192.94 h0.01
  text "V6" at -108.66,-192.94 h0.01
  text "V5" at -134.25,-192.94 h0.01
  text "V4" at -159.84,-192.94 h0.01
  text "V3" at -185.43,-192.94 h0.01
  text "T15" at 121.65,-141.76 h0.01
  text "U3" at -185.43,-167.35 h0.01
  text "U8" at -57.48,-167.35 h0.01
  text "U19" at 224.01,-167.35 h0.01
  text "F6" at -108.66,114.14 h0.01
  text "F16" at 147.24,114.14 h0.01
  text "F4" at -159.84,114.14 h0.01
  text "C13" at 70.47,190.91 h0.01
  text "N10" at -6.3,-64.99 h0.01
  text "N16" at 147.24,-64.99 h0.01
  text "Y20" at 249.6,-244.12 h0.01
  text "Y1" at -236.61,-244.12 h0.01
  text "A20" at 249.6,242.09 h0.01
  text "D20" at 249.6,165.32 h0.01
  text "G17" at 172.83,88.55 h0.01
  text "H19" at 224.01,62.96 h0.01
  text "F18" at 198.42,114.14 h0.01
  text "D19" at 224.01,165.32 h0.01
  text "J19" at 224.01,37.37 h0.01
  text "J20" at 249.6,37.37 h0.01
  text "F17" at 172.83,114.14 h0.01
  text "C20" at 249.6,190.91 h0.01
  text "J18" at 198.42,37.37 h0.01
  text "J17" at 172.83,37.37 h0.01
  text "F19" at 224.01,114.14 h0.01
  text "H18" at 198.42,62.96 h0.01
  text "G19" at 224.01,88.55 h0.01
  text "M17" at 172.83,-39.4 h0.01
  text "G20" at 249.6,88.55 h0.01
  text "F20" at 249.6,114.14 h0.01
  text "N18" at 198.42,-64.99 h0.01
  text "E20" at 249.6,139.73 h0.01
  text "G18" at 198.42,88.55 h0.01
  text "H17" at 172.83,62.96 h0.01
3D body: height 150, standoff 0, extent -260,-260 260,260

## BGA47CP65X69_8X6_410X613X81B30N [mm] "Ball Grid Array (BGA), 0.65 mm row pitch X 0.69 mm col. pitch, rect.; 48 pin, 4.102 mm L X 6.135 mm W X 0.815 mm H body"
height 0.815
pads (47):
  round 0.27 smd: A1(-2.415,1.625) A2(-1.725,1.625) A3(-1.035,1.625) A4(-0.345,1.625) A5(0.345,1.625) A6(1.035,1.625) A7(1.725,1.625) A8(2.415,1.625) B1(-2.415,0.975) B2(-1.725,0.975) B3(-1.035,0.975) B4(-0.345,0.975) B5(0.345,0.975) B7(1.725,0.975) B8(2.415,0.975) C1(-2.415,0.325) C2(-1.725,0.325) C3(-1.035,0.325) C4(-0.345,0.325) C5(0.345,0.325) C6(1.035,0.325) C7(1.725,0.325) C8(2.415,0.325) D1(-2.415,-0.325) D2(-1.725,-0.325) D3(-1.035,-0.325) D4(-0.345,-0.325) D5(0.345,-0.325) D6(1.035,-0.325) D7(1.725,-0.325) D8(2.415,-0.325) E1(-2.415,-0.975) E2(-1.725,-0.975) E3(-1.035,-0.975) E4(-0.345,-0.975) E5(0.345,-0.975) E6(1.035,-0.975) E7(1.725,-0.975) E8(2.415,-0.975) F1(-2.415,-1.625) F2(-1.725,-1.625) F3(-1.035,-1.625) F4(-0.345,-1.625) F5(0.345,-1.625) F6(1.035,-1.625) F7(1.725,-1.625) F8(2.415,-1.625)
Top Overlay:
  circle w0.25: c-2.415,2.494 r0.125
  lines w0.12: -3.08,-2.064 -3.08,2.064 3.08,2.064 3.08,-2.064 -3.08,-2.064
Mechanical 11:
  lines w0.12: -3.08,-2.064 -3.08,1.064 -2.08,2.064 3.08,2.064 3.08,-2.064 -3.08,-2.064
Top Assembly:
  circle w0.025: c-2.415,1.625 r0.15
  circle w0.025: c-1.725,1.625 r0.15
  circle w0.025: c-1.035,1.625 r0.15
  circle w0.025: c-0.345,1.625 r0.15
  circle w0.025: c0.345,1.625 r0.15
  circle w0.025: c1.035,1.625 r0.15
  circle w0.025: c1.725,1.625 r0.15
  circle w0.025: c2.415,1.625 r0.15
  circle w0.025: c-2.415,0.975 r0.15
  circle w0.025: c-1.725,0.975 r0.15
  circle w0.025: c-1.035,0.975 r0.15
  circle w0.025: c-0.345,0.975 r0.15
  circle w0.025: c0.345,0.975 r0.15
  circle w0.025: c1.725,0.975 r0.15
  circle w0.025: c2.415,0.975 r0.15
  circle w0.025: c-2.415,0.325 r0.15
  circle w0.025: c-1.725,0.325 r0.15
  circle w0.025: c-1.035,0.325 r0.15
  circle w0.025: c-0.345,0.325 r0.15
  circle w0.025: c0.345,0.325 r0.15
  circle w0.025: c1.035,0.325 r0.15
  circle w0.025: c1.725,0.325 r0.15
  circle w0.025: c2.415,0.325 r0.15
  circle w0.025: c-2.415,-0.325 r0.15
  circle w0.025: c-1.725,-0.325 r0.15
  circle w0.025: c-1.035,-0.325 r0.15
  circle w0.025: c-0.345,-0.325 r0.15
  circle w0.025: c0.345,-0.325 r0.15
  circle w0.025: c1.035,-0.325 r0.15
  circle w0.025: c1.725,-0.325 r0.15
  circle w0.025: c2.415,-0.325 r0.15
  circle w0.025: c-2.415,-0.975 r0.15
  circle w0.025: c-1.725,-0.975 r0.15
  circle w0.025: c-1.035,-0.975 r0.15
  circle w0.025: c-0.345,-0.975 r0.15
  circle w0.025: c0.345,-0.975 r0.15
  circle w0.025: c1.035,-0.975 r0.15
  circle w0.025: c1.725,-0.975 r0.15
  circle w0.025: c2.415,-0.975 r0.15
  circle w0.025: c-2.415,-1.625 r0.15
  circle w0.025: c-1.725,-1.625 r0.15
  circle w0.025: c-1.035,-1.625 r0.15
  circle w0.025: c-0.345,-1.625 r0.15
  circle w0.025: c0.345,-1.625 r0.15
  circle w0.025: c1.035,-1.625 r0.15
  circle w0.025: c1.725,-1.625 r0.15
  circle w0.025: c2.415,-1.625 r0.15
  lines w0.025: -3.067,-2.051 -3.067,2.051 3.067,2.051 3.067,-2.051 -3.067,-2.051
Mechanical 15:
  circle w0.05: c0,0 r0.25
  lines w0.05: -0.35,0 0.35,0 ; 0,-0.35 0,0.35 ; -3.14,-2.124 3.14,-2.124 3.14,2.124 -3.14,2.124 -3.14,-2.124

## BGA92CP63X72_11X9_634X893X79B28N [mm] "Ball Grid Array (BGA), 0.63 mm row pitch X 0.72 mm col. pitch, rect.; 92 pin, 6.34 mm L X 8.939 mm W X 0.795 mm H body"
height 0.795
pads (92):
  round 0.22 smd: A1(3.6,-2.52) A2(2.88,-2.52) A3(2.16,-2.52) A4(1.44,-2.52) A5(0.72,-2.52) A6(0,-2.52) A7(-0.72,-2.52) A8(-1.44,-2.52) A9(-2.16,-2.52) A10(-2.88,-2.52) A11(-3.6,-2.52) B1(3.6,-1.89) B2(2.88,-1.89) B3(2.16,-1.89) B4(1.44,-1.89) B7(-0.72,-1.89) B8(-1.44,-1.89) B9(-2.16,-1.89) B10(-2.88,-1.89) B11(-3.6,-1.89) C1(3.6,-1.26) C2(2.88,-1.26) C3(2.16,-1.26) C4(1.44,-1.26) C7(-0.72,-1.26) C8(-1.44,-1.26) C9(-2.16,-1.26) C10(-2.88,-1.26) C11(-3.6,-1.26) D1(3.6,-0.63) D2(2.88,-0.63) D3(2.16,-0.63) D4(1.44,-0.63) D7(-0.72,-0.63) D8(-1.44,-0.63) D9(-2.16,-0.63) D10(-2.88,-0.63) D11(-3.6,-0.63) E1(3.6,0) E2(2.88,0) E3(2.16,0) E4(1.44,0) E5(0.72,0) E6(0,0) E7(-0.72,0) E8(-1.44,0) E9(-2.16,0) E10(-2.88,0) E11(-3.6,0) F1(3.6,0.63) F2(2.88,0.63) F3(2.16,0.63) F4(1.44,0.63) F5(0.72,0.63) F6(0,0.63) F7(-0.72,0.63) F8(-1.44,0.63) F9(-2.16,0.63) F10(-2.88,0.63) F11(-3.6,0.63) G1(3.6,1.26) G2(2.88,1.26) G3(2.16,1.26) G4(1.44,1.26) G5(0.72,1.26) G6(0,1.26) G7(-0.72,1.26) G8(-1.44,1.26) G9(-2.16,1.26) G10(-2.88,1.26) G11(-3.6,1.26) H1(3.6,1.89) H2(2.88,1.89) H3(2.16,1.89) H4(1.44,1.89) H5(0.72,1.89) H6(0,1.89) H7(-0.72,1.89) H8(-1.44,1.89) H9(-2.16,1.89) H10(-2.88,1.89) H11(-3.6,1.89) J1(3.6,2.52) J2(2.88,2.52) J3(2.16,2.52) J4(1.44,2.52) J6(0,2.52) J7(-0.72,2.52) J8(-1.44,2.52) J9(-2.16,2.52) J10(-2.88,2.52) J11(-3.6,2.52)
Top Overlay:
  circle w0.25: c3.6,-3.673 r0.125
  lines w0.12: -4.542,-3.242 -4.542,3.242 4.542,3.242 4.542,-3.242 -4.542,-3.242
Mechanical 11:
  lines w0.12: -4.482,-3.183 -4.482,3.183 4.482,3.183 4.482,-2.183 3.482,-3.183 -4.482,-3.183
Top Assembly:
  circle w0.025: c-3.6,2.52 r0.14
  circle w0.025: c-2.88,2.52 r0.14
  circle w0.025: c-2.16,2.52 r0.14
  circle w0.025: c-1.44,2.52 r0.14
  circle w0.025: c-0.72,2.52 r0.14
  circle w0.025: c0,2.52 r0.14
  circle w0.025: c1.44,2.52 r0.14
  circle w0.025: c2.16,2.52 r0.14
  circle w0.025: c2.88,2.52 r0.14
  circle w0.025: c3.6,2.52 r0.14
  circle w0.025: c-3.6,1.89 r0.14
  circle w0.025: c-2.88,1.89 r0.14
  circle w0.025: c-2.16,1.89 r0.14
  circle w0.025: c-1.44,1.89 r0.14
  circle w0.025: c-0.72,1.89 r0.14
  circle w0.025: c0,1.89 r0.14
  circle w0.025: c0.72,1.89 r0.14
  circle w0.025: c1.44,1.89 r0.14
  circle w0.025: c2.16,1.89 r0.14
  circle w0.025: c2.88,1.89 r0.14
  circle w0.025: c3.6,1.89 r0.14
  circle w0.025: c-3.6,1.26 r0.14
  circle w0.025: c-2.88,1.26 r0.14
  circle w0.025: c-2.16,1.26 r0.14
  circle w0.025: c-1.44,1.26 r0.14
  circle w0.025: c-0.72,1.26 r0.14
  circle w0.025: c0,1.26 r0.14
  circle w0.025: c0.72,1.26 r0.14
  circle w0.025: c1.44,1.26 r0.14
  circle w0.025: c2.16,1.26 r0.14
  circle w0.025: c2.88,1.26 r0.14
  circle w0.025: c3.6,1.26 r0.14
  circle w0.025: c-3.6,0.63 r0.14
  circle w0.025: c-2.88,0.63 r0.14
  circle w0.025: c-2.16,0.63 r0.14
  circle w0.025: c-1.44,0.63 r0.14
  circle w0.025: c-0.72,0.63 r0.14
  circle w0.025: c0,0.63 r0.14
  circle w0.025: c0.72,0.63 r0.14
  circle w0.025: c1.44,0.63 r0.14
  circle w0.025: c2.16,0.63 r0.14
  circle w0.025: c2.88,0.63 r0.14
  circle w0.025: c3.6,0.63 r0.14
  circle w0.025: c-3.6,0 r0.14
  circle w0.025: c-2.88,0 r0.14
  circle w0.025: c-2.16,0 r0.14
  circle w0.025: c-1.44,0 r0.14
  circle w0.025: c-0.72,0 r0.14
  circle w0.025: c0,0 r0.14
  circle w0.025: c0.72,0 r0.14
  circle w0.025: c1.44,0 r0.14
  circle w0.025: c2.16,0 r0.14
  circle w0.025: c2.88,0 r0.14
  circle w0.025: c3.6,0 r0.14
  circle w0.025: c-3.6,-0.63 r0.14
  circle w0.025: c-2.88,-0.63 r0.14
  circle w0.025: c-2.16,-0.63 r0.14
  circle w0.025: c-1.44,-0.63 r0.14
  circle w0.025: c-0.72,-0.63 r0.14
  circle w0.025: c1.44,-0.63 r0.14
  circle w0.025: c2.16,-0.63 r0.14
  circle w0.025: c2.88,-0.63 r0.14
  circle w0.025: c3.6,-0.63 r0.14
  circle w0.025: c-3.6,-1.26 r0.14
  circle w0.025: c-2.88,-1.26 r0.14
  circle w0.025: c-2.16,-1.26 r0.14
  circle w0.025: c-1.44,-1.26 r0.14
  circle w0.025: c-0.72,-1.26 r0.14
  circle w0.025: c1.44,-1.26 r0.14
  circle w0.025: c2.16,-1.26 r0.14
  circle w0.025: c2.88,-1.26 r0.14
  circle w0.025: c3.6,-1.26 r0.14
  circle w0.025: c-3.6,-1.89 r0.14
  circle w0.025: c-2.88,-1.89 r0.14
  circle w0.025: c-2.16,-1.89 r0.14
  circle w0.025: c-1.44,-1.89 r0.14
  circle w0.025: c-0.72,-1.89 r0.14
  circle w0.025: c1.44,-1.89 r0.14
  circle w0.025: c2.16,-1.89 r0.14
  circle w0.025: c2.88,-1.89 r0.14
  circle w0.025: c3.6,-1.89 r0.14
  circle w0.025: c-3.6,-2.52 r0.14
  circle w0.025: c-2.88,-2.52 r0.14
  circle w0.025: c-2.16,-2.52 r0.14
  circle w0.025: c-1.44,-2.52 r0.14
  circle w0.025: c-0.72,-2.52 r0.14
  circle w0.025: c0,-2.52 r0.14
  circle w0.025: c0.72,-2.52 r0.14
  circle w0.025: c1.44,-2.52 r0.14
  circle w0.025: c2.16,-2.52 r0.14
  circle w0.025: c2.88,-2.52 r0.14
  circle w0.025: c3.6,-2.52 r0.14
  lines w0.025: -4.47,-3.17 -4.47,3.17 4.47,3.17 4.47,-3.17 -4.47,-3.17
Mechanical 15:
  circle w0.05: c0,0 r0.25
  lines w0.05: -0.35,0 0.35,0 ; 0,-0.35 0,0.35
3D body: height 0.25, standoff 0, extent -0.254,0 0,0.254